# Altium integrated library WCAP-ATLL_rev15a.intlib: 209 symbols (part 3 of 3)
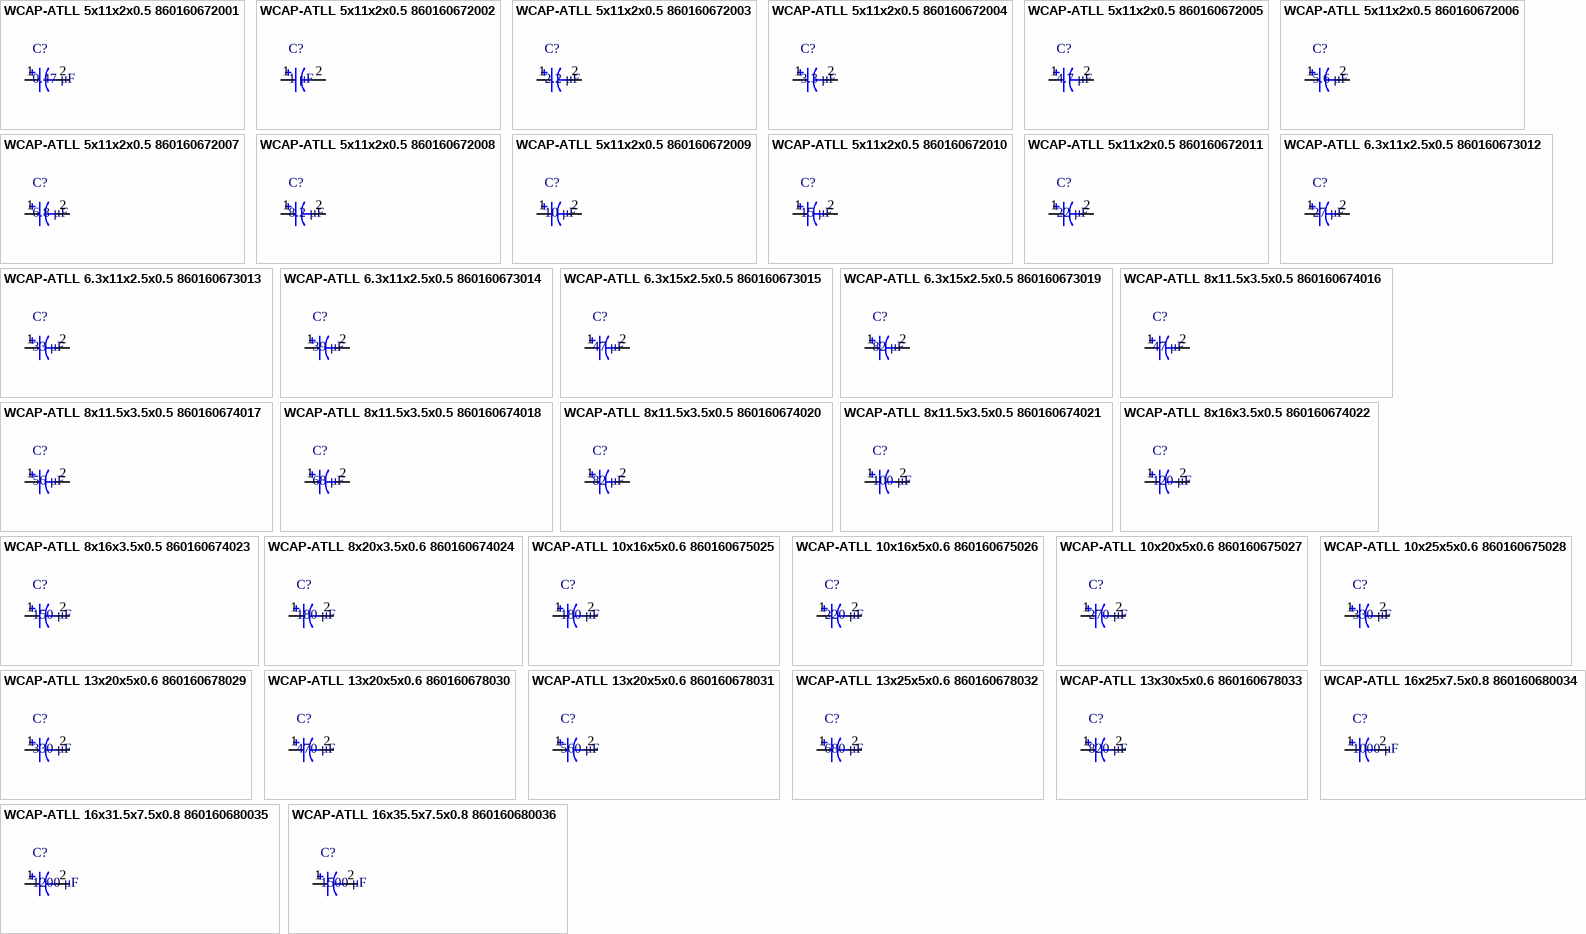
[diagram p8: symbols WCAP-ATLL 5x11x2x0.5 860160672001 to WCAP-ATLL 16x35.5x7.5x0.8 860160680036]

## WCAP-ATLL 13x25x5x0.6 860160678032
designator C?, comment 680 μF
WCAP-ATLL Aluminum Electrolytic Capacitors , 680 μF; + / - 20%; 50 V , 13 x 25; Manufacturer: Wurth Elektronik; partNo: 860160678032; E-mail: libraries@we-online.com; Characteristics: Aluminum Electrolytic Capacitor;Recommended soldering: Wave;Operating temperature: –55 °C to +105 °C;Low impedance and high temperature product series;Load life: 3000–10000 h @ +105 °C; ComponentLink1Description: Manufacturer; ComponentLink1URL: http://www.we-online.com; ComponentLink2Description: Datasheet; ComponentLink2URL: http://katalog.we-online.de/pbs/datasheet/860160678032.pdf; Created by: Karrer Zheng; Created Date: 5/13/2015; Capacitance: 680 μF; Application: Used in circuit with rigorous conditions and high ambient temperature;  applied to the secondary side output filtering loop, used in switching power supply with higher operating temperature, DC-DC converter, AC-DC converter, adapter, charger, TV, VCR, DC motor circuit filter, high-end switching power supply, LCD TV, energy saving lamps, electronic ballast, LED lamp and etc.
footprint WCAP-ATLL 13x25x5x0.6
pins: 1, 2

## WCAP-ATLL 13x30x5x0.6 860160678033
designator C?, comment 820 μF
WCAP-ATLL Aluminum Electrolytic Capacitors , 820 μF; + / - 20%; 50 V , 13 x 30; Manufacturer: Wurth Elektronik; partNo: 860160678033; E-mail: libraries@we-online.com; Characteristics: Aluminum Electrolytic Capacitor;Recommended soldering: Wave;Operating temperature: –55 °C to +105 °C;Low impedance and high temperature product series;Load life: 3000–10000 h @ +105 °C; ComponentLink1Description: Manufacturer; ComponentLink1URL: http://www.we-online.com; ComponentLink2Description: Datasheet; ComponentLink2URL: http://katalog.we-online.de/pbs/datasheet/860160678033.pdf; Created by: Karrer Zheng; Created Date: 5/13/2015; Capacitance: 820 μF; Application: Used in circuit with rigorous conditions and high ambient temperature;  applied to the secondary side output filtering loop, used in switching power supply with higher operating temperature, DC-DC converter, AC-DC converter, adapter, charger, TV, VCR, DC motor circuit filter, high-end switching power supply, LCD TV, energy saving lamps, electronic ballast, LED lamp and etc.
footprint WCAP-ATLL 13x30x5x0.6
pins: 1, 2

## WCAP-ATLL 16x25x7.5x0.8 860160680034
designator C?, comment 1000 μF
WCAP-ATLL Aluminum Electrolytic Capacitors , 1000 μF; + / - 20%; 50 V , 16 x 25; Manufacturer: Wurth Elektronik; partNo: 860160680034; E-mail: libraries@we-online.com; Characteristics: Aluminum Electrolytic Capacitor;Recommended soldering: Wave;Operating temperature: –55 °C to +105 °C;Low impedance and high temperature product series;Load life: 3000–10000 h @ +105 °C; ComponentLink1Description: Manufacturer; ComponentLink1URL: http://www.we-online.com; ComponentLink2Description: Datasheet; ComponentLink2URL: http://katalog.we-online.de/pbs/datasheet/860160680034.pdf; Created by: Karrer Zheng; Created Date: 5/13/2015; Capacitance: 1000 μF; Application: Used in circuit with rigorous conditions and high ambient temperature;  applied to the secondary side output filtering loop, used in switching power supply with higher operating temperature, DC-DC converter, AC-DC converter, adapter, charger, TV, VCR, DC motor circuit filter, high-end switching power supply, LCD TV, energy saving lamps, electronic ballast, LED lamp and etc.
footprint WCAP-ATLL 16x25x7.5x0.8
pins: 1, 2

## WCAP-ATLL 16x31.5x7.5x0.8 860160680035
designator C?, comment 1200 μF
WCAP-ATLL Aluminum Electrolytic Capacitors , 1200 μF; + / - 20%; 50 V , 16 x 31,5; Manufacturer: Wurth Elektronik; partNo: 860160680035; E-mail: libraries@we-online.com; Characteristics: Aluminum Electrolytic Capacitor;Recommended soldering: Wave;Operating temperature: –55 °C to +105 °C;Low impedance and high temperature product series;Load life: 3000–10000 h @ +105 °C; ComponentLink1Description: Manufacturer; ComponentLink1URL: http://www.we-online.com; ComponentLink2Description: Datasheet; ComponentLink2URL: http://katalog.we-online.de/pbs/datasheet/860160680035.pdf; Created by: Karrer Zheng; Created Date: 5/13/2015; Capacitance: 1200 μF; Application: Used in circuit with rigorous conditions and high ambient temperature;  applied to the secondary side output filtering loop, used in switching power supply with higher operating temperature, DC-DC converter, AC-DC converter, adapter, charger, TV, VCR, DC motor circuit filter, high-end switching power supply, LCD TV, energy saving lamps, electronic ballast, LED lamp and etc.
footprint WCAP-ATLL 16x31.5x7.5x0.8
pins: 1, 2

## WCAP-ATLL 16x35.5x7.5x0.8 860160680036
designator C?, comment 1500 μF
WCAP-ATLL Aluminum Electrolytic Capacitors , 1500 μF; + / - 20%; 50 V , 16 x 35,5; Manufacturer: Wurth Elektronik; partNo: 860160680036; E-mail: libraries@we-online.com; Characteristics: Aluminum Electrolytic Capacitor;Recommended soldering: Wave;Operating temperature: –55 °C to +105 °C;Low impedance and high temperature product series;Load life: 3000–10000 h @ +105 °C; ComponentLink1Description: Manufacturer; ComponentLink1URL: http://www.we-online.com; ComponentLink2Description: Datasheet; ComponentLink2URL: http://katalog.we-online.de/pbs/datasheet/860160680036.pdf; Created by: Karrer Zheng; Created Date: 5/13/2015; Capacitance: 1500 μF; Application: Used in circuit with rigorous conditions and high ambient temperature;  applied to the secondary side output filtering loop, used in switching power supply with higher operating temperature, DC-DC converter, AC-DC converter, adapter, charger, TV, VCR, DC motor circuit filter, high-end switching power supply, LCD TV, energy saving lamps, electronic ballast, LED lamp and etc.
footprint WCAP-ATLL 16x35.5x7.5x0.8
pins: 1, 2